# Altium footprint library cool_library.PcbLib: 1182 footprints (part 53 of 75)
Each footprint in its own frame and in the unit in brackets; x right, y up, seen from the top. Pads: shape width x height; smd on the part's side, far side on the other; paste and mask are expansions set on the pad; w line width, h text height; cw(c..) or ccw(c..) is an arc to the next point about the centre after c.
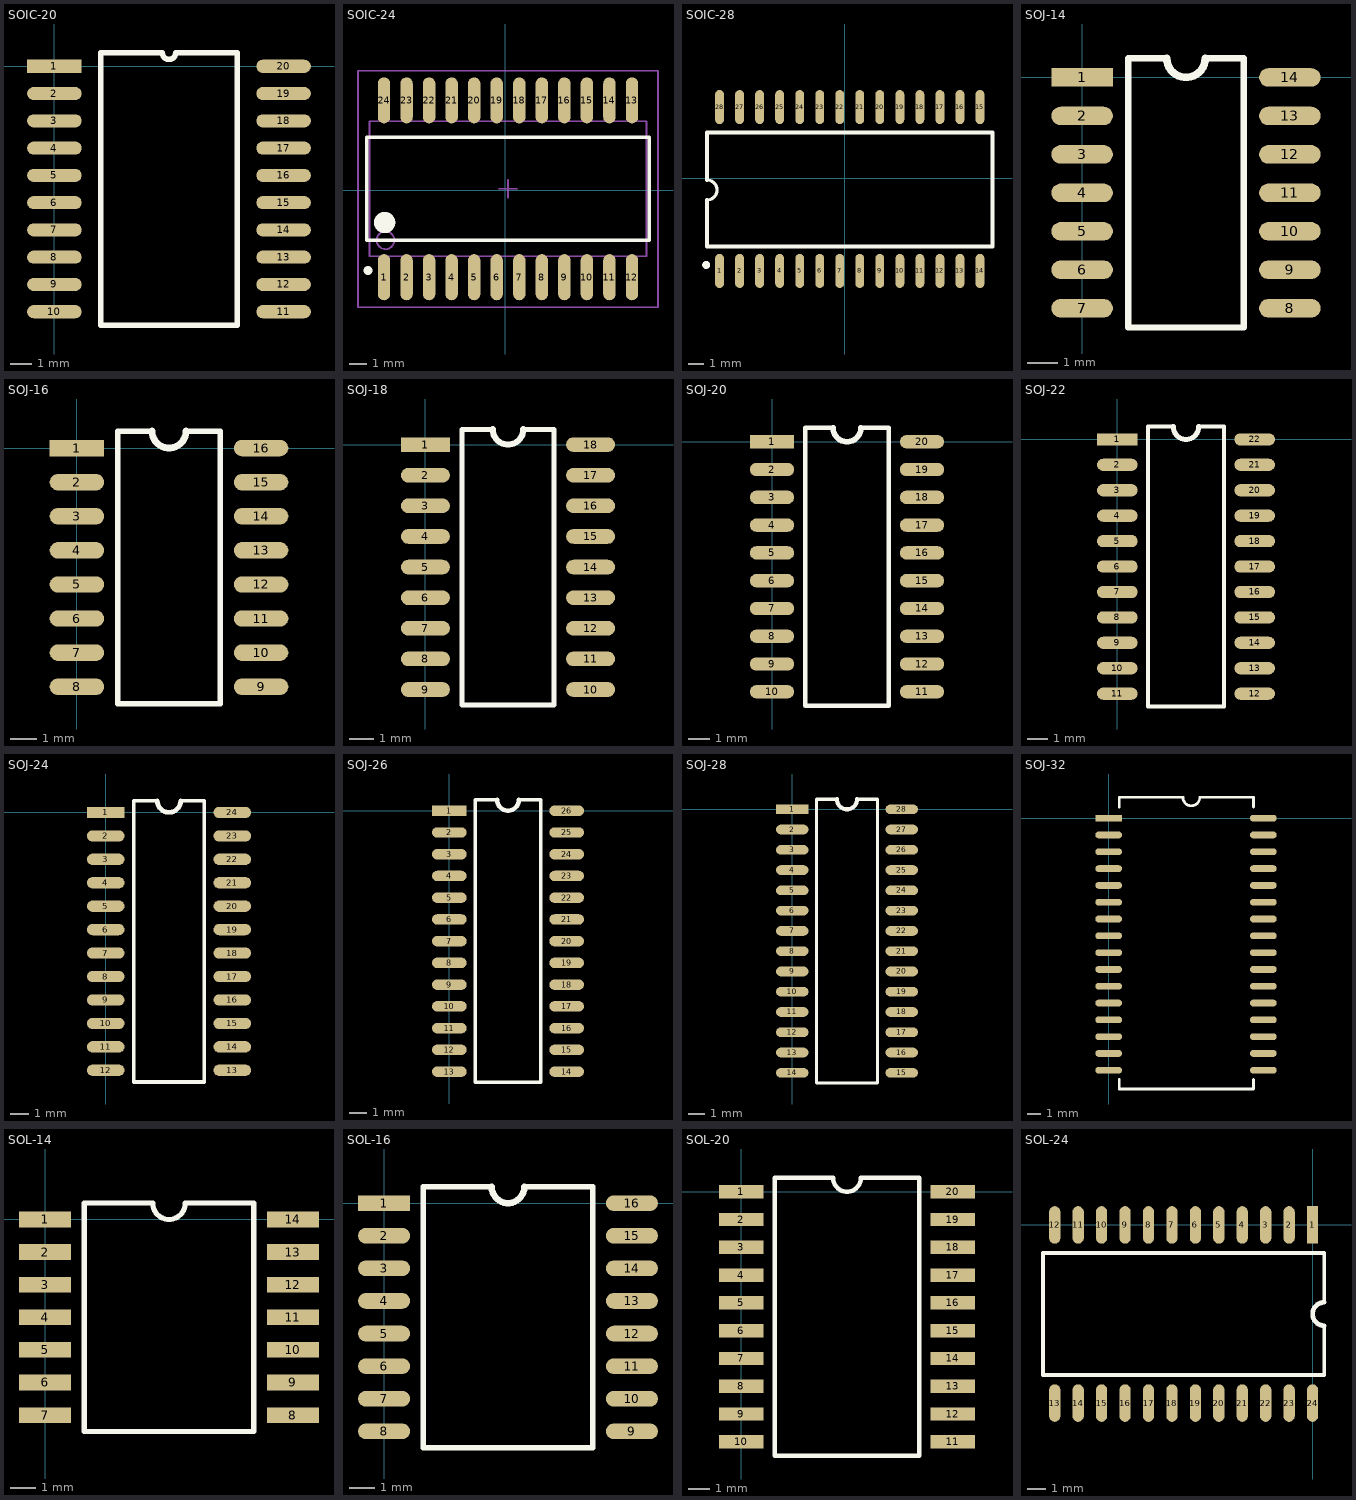
[diagram p52: the footprints below, top view; thin cyan lines are the x and y axes]

## SOIC-20 [mil]
height 39.37
pads (20):
  rect 100x24 smd: 1(0,0)
  oval 100x24 smd: 2(0,-50) 3(0,-100) 4(0,-150) 5(0,-200) 6(0,-250) 7(0,-300) 8(0,-350) 9(0,-400) 10(0,-450) 11(420,-450) 12(420,-400) 13(420,-350) 14(420,-300) 15(420,-250) 16(420,-200) 17(420,-150) 18(420,-100) 19(420,-50) 20(420,0)
Top Overlay:
  lines w10: 85,-475 85,25 197.5,25 ccw(c210,25) 222.5,25 335,25 335,-475 85,-475
3D body: height 101.38, standoff -0.98, extent 1.34,-480.9 418.66,30.91

## SOIC-24 [mm]
pads (24):
  oval 0.7x2.6 smd: 1(-6.841,-4.906) 2(-5.571,-4.906) 3(-4.301,-4.906) 4(-3.031,-4.906) 5(-1.761,-4.906) 6(-0.491,-4.906) 7(0.779,-4.906) 8(2.049,-4.906) 9(3.319,-4.906) 10(4.589,-4.906) 11(5.859,-4.906) 12(7.129,-4.906) 13(7.129,5.056) 14(5.859,5.056) 15(4.589,5.056) 16(3.319,5.056) 17(2.049,5.056) 18(0.779,5.056) 19(-0.491,5.056) 20(-1.761,5.056) 21(-3.031,5.056) 22(-4.301,5.056) 23(-5.571,5.056) 24(-6.841,5.056)
Top Overlay:
  circle w0.25: c-7.741,-4.525 r0.125
  circle w0.6: c-6.806,-1.825 r0.3
  lines w0.2: -7.806,-2.825 8.094,-2.825 8.094,2.975 -7.806,2.975 -7.806,-2.825
Mechanical 13:
  circle w0.1: c-6.756,-2.825 r0.5
  lines w0.1: -7.656,-3.725 7.944,-3.725 7.944,3.875 -7.656,3.875 -7.656,-3.725
Mechanical 15:
  lines w0.1: -0.356,0.075 0.644,0.075 ; 0.144,-0.425 0.144,0.575 ; -8.306,-6.604 8.594,-6.604 8.594,6.731 -8.306,6.731 -8.306,-6.604
3D body: height 2.7, standoff 0.1, extent -7.656,-3.725 7.944,3.875

## SOIC-28 [mil]
pads (28):
  oval 22x85 smd: 1(-312.05,-230.87) 2(-262.05,-230.87) 3(-212.05,-230.87) 4(-162.05,-230.87) 5(-112.05,-230.87) 6(-62.05,-230.87) 7(-12.05,-230.87) 8(37.95,-230.87) 9(87.95,-230.87) 10(137.95,-230.87) 11(187.95,-230.87) 12(237.95,-230.87) 13(287.95,-230.87) 14(337.95,-230.87) 15(337.95,178.15) 16(287.95,178.15) 17(237.95,178.15) 18(187.95,178.15) 19(137.95,178.15) 20(87.95,178.15) 21(37.95,178.15) 22(-12.05,178.15) 23(-62.05,178.15) 24(-112.05,178.15) 25(-162.05,178.15) 26(-212.05,178.15) 27(-262.05,178.15) 28(-312.05,178.15)
Top Overlay:
  circle w9.84: c-345.51,-215.87 r4.92
  lines w7.87: -343.35,-53.86 ccw(c-343.35,-28.86) -343.35,-3.86
  lines w10: -343.35,-53.86 -343.35,-170 369.25,-170 369.25,115 -343.35,115 -343.35,-3.86
3D body: height 106.3, standoff 3.94, extent -343.37,-197.97 369.27,144.19
3D body: height 106.3, standoff 3.94, extent -343.37,-197.97 369.27,144.19

## SOJ-14 [mil]
pads (14):
  rect 80x24 smd: 1(0,0)
  oval 80x24 smd: 2(0,-50) 3(0,-100) 4(0,-150) 5(0,-200) 6(0,-250) 7(0,-300) 8(270,-300) 9(270,-250) 10(270,-200) 11(270,-150) 12(270,-100) 13(270,-50) 14(270,0)
Top Overlay:
  lines w8: 110,25 60,25 60,-325 210,-325 210,25 160,25
  lines w10: 110,25 ccw(c135,25) 160,25

## SOJ-16 [mil]
pads (16):
  rect 80x24 smd: 1(0,0)
  oval 80x24 smd: 2(0,-50) 3(0,-100) 4(0,-150) 5(0,-200) 6(0,-250) 7(0,-300) 8(0,-350) 9(270,-350) 10(270,-300) 11(270,-250) 12(270,-200) 13(270,-150) 14(270,-100) 15(270,-50) 16(270,0)
Top Overlay:
  lines w8: 110,25 60,25 60,-375 210,-375 210,25 160,25
  lines w10: 110,25 ccw(c135,25) 160,25

## SOJ-18 [mil]
pads (18):
  rect 80x24 smd: 1(0,0)
  oval 80x24 smd: 2(0,-50) 3(0,-100) 4(0,-150) 5(0,-200) 6(0,-250) 7(0,-300) 8(0,-350) 9(0,-400) 10(270,-400) 11(270,-350) 12(270,-300) 13(270,-250) 14(270,-200) 15(270,-150) 16(270,-100) 17(270,-50) 18(270,0)
Top Overlay:
  lines w8: 110,25 60,25 60,-425 210,-425 210,25 160,25
  lines w10: 110,25 ccw(c135,25) 160,25

## SOJ-20 [mil]
pads (20):
  rect 80x24 smd: 1(0,0)
  oval 80x24 smd: 2(0,-50) 3(0,-100) 4(0,-150) 5(0,-200) 6(0,-250) 7(0,-300) 8(0,-350) 9(0,-400) 10(0,-450) 11(270,-450) 12(270,-400) 13(270,-350) 14(270,-300) 15(270,-250) 16(270,-200) 17(270,-150) 18(270,-100) 19(270,-50) 20(270,0)
Top Overlay:
  lines w8: 110,25 60,25 60,-475 210,-475 210,25 160,25
  lines w10: 110,25 ccw(c135,25) 160,25

## SOJ-22 [mil]
pads (22):
  rect 80x24 smd: 1(0,0)
  oval 80x24 smd: 2(0,-50) 3(0,-100) 4(0,-150) 5(0,-200) 6(0,-250) 7(0,-300) 8(0,-350) 9(0,-400) 10(0,-450) 11(0,-500) 12(270,-500) 13(270,-450) 14(270,-400) 15(270,-350) 16(270,-300) 17(270,-250) 18(270,-200) 19(270,-150) 20(270,-100) 21(270,-50) 22(270,0)
Top Overlay:
  lines w8: 110,25 60,25 60,-525 210,-525 210,25 160,25
  lines w10: 110,25 ccw(c135,25) 160,25

## SOJ-24 [mil]
pads (24):
  rect 80x24 smd: 1(0,0)
  oval 80x24 smd: 2(0,-50) 3(0,-100) 4(0,-150) 5(0,-200) 6(0,-250) 7(0,-300) 8(0,-350) 9(0,-400) 10(0,-450) 11(0,-500) 12(0,-550) 13(270,-550) 14(270,-500) 15(270,-450) 16(270,-400) 17(270,-350) 18(270,-300) 19(270,-250) 20(270,-200) 21(270,-150) 22(270,-100) 23(270,-50) 24(270,0)
Top Overlay:
  lines w8: 110,25 60,25 60,-575 210,-575 210,25 160,25
  lines w10: 110,25 ccw(c135,25) 160,25

## SOJ-26 [mil]
pads (26):
  rect 80x24 smd: 1(0,0)
  oval 80x24 smd: 2(0,-50) 3(0,-100) 4(0,-150) 5(0,-200) 6(0,-250) 7(0,-300) 8(0,-350) 9(0,-400) 10(0,-450) 11(0,-500) 12(0,-550) 13(0,-600) 14(270,-600) 15(270,-550) 16(270,-500) 17(270,-450) 18(270,-400) 19(270,-350) 20(270,-300) 21(270,-250) 22(270,-200) 23(270,-150) 24(270,-100) 25(270,-50) 26(270,0)
Top Overlay:
  lines w8: 110,25 60,25 60,-625 210,-625 210,25 160,25
  lines w10: 110,25 ccw(c135,25) 160,25

## SOJ-28 [mil]
pads (28):
  rect 80x24 smd: 1(0,0)
  oval 80x24 smd: 2(0,-50) 3(0,-100) 4(0,-150) 5(0,-200) 6(0,-250) 7(0,-300) 8(0,-350) 9(0,-400) 10(0,-450) 11(0,-500) 12(0,-550) 13(0,-600) 14(0,-650) 15(270,-650) 16(270,-600) 17(270,-550) 18(270,-500) 19(270,-450) 20(270,-400) 21(270,-350) 22(270,-300) 23(270,-250) 24(270,-200) 25(270,-150) 26(270,-100) 27(270,-50) 28(270,0)
Top Overlay:
  lines w8: 110,25 60,25 60,-675 210,-675 210,25 160,25
  lines w10: 110,25 ccw(c135,25) 160,25

## SOJ-32 [mil]
pads (32):
  rect 80x20 smd: 1(0,0)
  oval 80x20 smd: 2(0,-50) 3(0,-100) 4(0,-150) 5(0,-200) 6(0,-250) 7(0,-300) 8(0,-350) 9(0,-400) 10(0,-450) 11(0,-500) 12(0,-550) 13(0,-600) 14(0,-650) 15(0,-700) 16(0,-750) 17(460,-750) 18(460,-700) 19(460,-650) 20(460,-600) 21(460,-550) 22(460,-500) 23(460,-450) 24(460,-400) 25(460,-350) 26(460,-300) 27(460,-250) 28(460,-200) 29(460,-150) 30(460,-100) 31(460,-50) 32(460,0)
Top Overlay:
  lines w7.87: 30.87,-777.47 30.87,-805.81 430.94,-805.81 430.94,-777.47 ; 30.87,33.47 30.87,61.81 220.91,61.81 ccw(c245.91,61.81) 270.9,61.81 430.94,61.81 430.94,33.47

## SOL-14 [mil]
pads (14):
  rect 80x24 smd: 1(0,0) 2(0,-50) 3(0,-100) 4(0,-150) 5(0,-200) 6(0,-250) 7(0,-300) 8(380,-300) 9(380,-250) 10(380,-200) 11(380,-150) 12(380,-100) 13(380,-50) 14(380,0)
Top Overlay:
  lines w8: 60,-325 60,25 165,25 ccw(c190,25) 215,25 320,25 320,-325 60,-325

## SOL-16 [mil]
pads (16):
  rect 80x24 smd: 1(0,0)
  oval 80x24 smd: 2(0,-50) 3(0,-100) 4(0,-150) 5(0,-200) 6(0,-250) 7(0,-300) 8(0,-350) 9(380,-350) 10(380,-300) 11(380,-250) 12(380,-200) 13(380,-150) 14(380,-100) 15(380,-50) 16(380,0)
Top Overlay:
  lines w8: 165,25 60,25 60,-375 320,-375 320,25 215,25
  lines w10: 165,25 ccw(c190,25) 215,25

## SOL-20 [mil]
pads (20):
  rect 80x24 smd: 1(0,0) 2(0,-50) 3(0,-100) 4(0,-150) 5(0,-200) 6(0,-250) 7(0,-300) 8(0,-350) 9(0,-400) 10(0,-450) 11(380,-450) 12(380,-400) 13(380,-350) 14(380,-300) 15(380,-250) 16(380,-200) 17(380,-150) 18(380,-100) 19(380,-50) 20(380,0)
Top Overlay:
  lines w8: 60,-475 60,25 165,25 ccw(c190,25) 215,25 320,25 320,-475 60,-475

## SOL-24 [mil]
pads (24):
  rect 24x80 smd: 1(0,0)
  oval 24x80 smd: 2(-50,0) 3(-100,0) 4(-150,0) 5(-200,0) 6(-250,0) 7(-300,0) 8(-350,0) 9(-400,0) 10(-450,0) 11(-500,0) 12(-550,0) 13(-550,-380) 14(-500,-380) 15(-450,-380) 16(-400,-380) 17(-350,-380) 18(-300,-380) 19(-250,-380) 20(-200,-380) 21(-150,-380) 22(-100,-380) 23(-50,-380) 24(0,-380)
Top Overlay:
  lines w8: 25,-215 25,-320 -575,-320 -575,-60 25,-60 25,-165
  lines w10: 25,-215 cw(c25,-190) 25,-165